# Altium footprint library 6-Connectors-4.PcbLib: 166 footprints (part 3 of 12)
Each footprint in its own frame and in the unit in brackets; x right, y up, seen from the top. Pads: shape width x height; smd on the part's side, far side on the other; paste and mask are expansions set on the pad; w line width, h text height; cw(c..) or ccw(c..) is an arc to the next point about the centre after c.
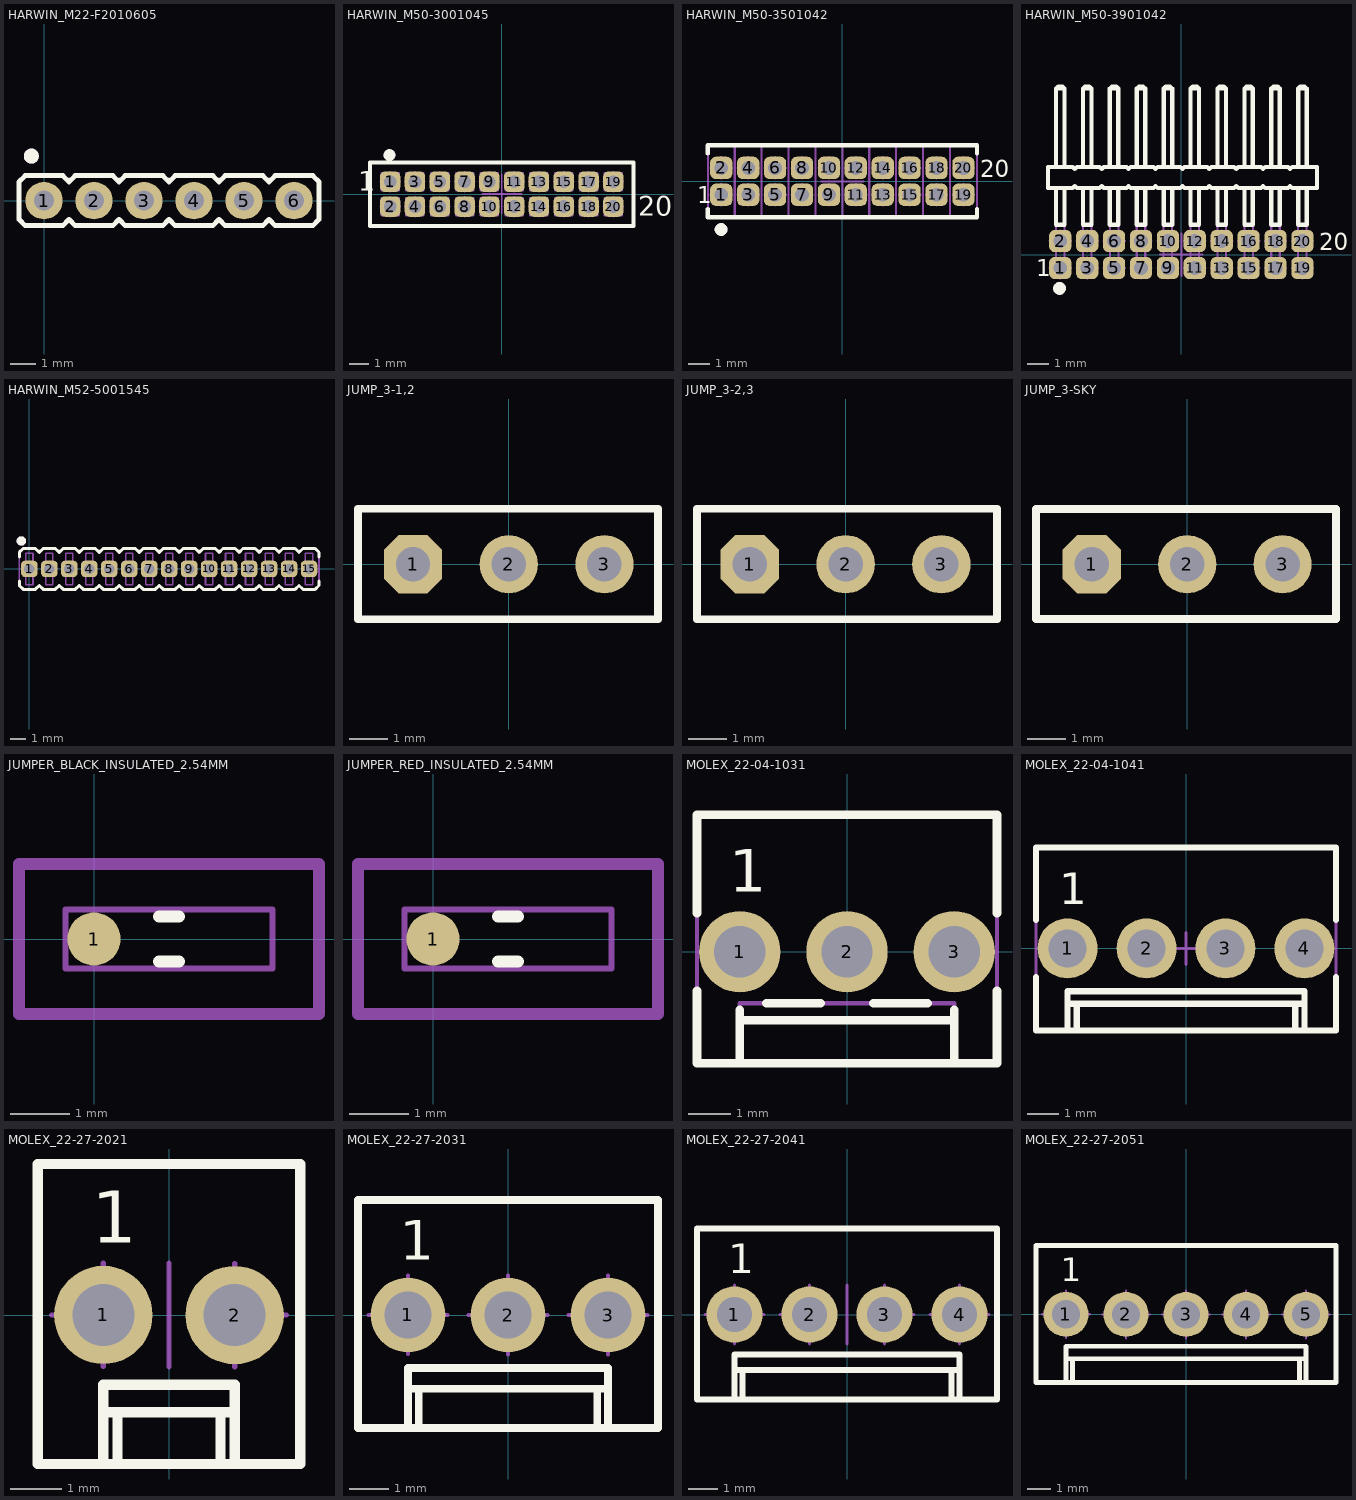
[diagram p2: the footprints below, top view; thin cyan lines are the x and y axes]

## HARWIN_M22-F2010605 [mm] "6 Contacts, Pitch 2mm - SIL Vertical Pin Header"
height 5
pads (6):
  round 1.5 hole 0.8: 1(0,0) 2(2,0) 3(4,0) 4(6,0) 5(8,0) 6(10,0)
Top Overlay:
  circle w0.3: c-0.508,1.778 r0.15
  lines w0.2: -1,-0.75 -0.75,-1 0.75,-1 1,-0.75 1.25,-1 2.75,-1 3,-0.75 3.25,-1 4.75,-1 5,-0.75 5.25,-1 6.75,-1 7,-0.75 7.25,-1 8.75,-1 9,-0.75 9.25,-1 10.75,-1 11,-0.75 11,0.75 10.75,1 9.25,1 9,0.75 8.75,1 7.25,1 7,0.75 6.75,1 5.25,1 5,0.75 4.75,1 3.25,1 3,0.75 2.75,1 1.25,1 1,0.75 0.75,1 -0.75,1 -1,0.75 -1,-0.75
Mechanical 8:
  lines w0.1: -0.5,0 0,0 ; 0,-0.5 0,0 ; 0,0.5 0,0 ; 0.5,0 0,0 ; 1.5,0 2,0 ; 2,-0.5 2,0 ; 2,0.5 2,0 ; 2.5,0 2,0 ; 3.5,0 4,0 ; 4,-0.5 4,0 ; 4,0.5 4,0 ; 4.5,0 4,0 ; 5.5,0 6,0 ; 6,-0.5 6,0 ; 6,0.5 6,0 ; 6.5,0 6,0 ; 7.5,0 8,0 ; 8,-0.5 8,0 ; 8,0.5 8,0 ; 8.5,0 8,0 ; 9.5,0 10,0 ; 10,-0.5 10,0 ; 10,0.5 10,0 ; 10.5,0 10,0
Mechanical 14:
  circle w0.3: c-0.508,1.778 r0.15
  lines w0.1: -1,-0.75 -0.75,-1 0.75,-1 1,-0.75 1.25,-1 2.75,-1 3,-0.75 3.25,-1 4.75,-1 5,-0.75 5.25,-1 6.75,-1 7,-0.75 7.25,-1 8.75,-1 9,-0.75 9.25,-1 10.75,-1 11,-0.75 11,0.75 10.75,1 9.25,1 9,0.75 8.75,1 7.25,1 7,0.75 6.75,1 5.25,1 5,0.75 4.75,1 3.25,1 3,0.75 2.75,1 1.25,1 1,0.75 0.75,1 -0.75,1 -1,0.75 -1,-0.75
3D body "HARWIN_M22-F2010605.stp": height 5, standoff -3.4, extent -1,-1 11,1

## HARWIN_M50-3001045 [mm] "20 Contacts, Pitch 1.27mm - Top Entry, Dual Row Through Mount Socket"
height 4.55
pads (20):
  rrect50% 1.05x1.05 hole 0.65: 1(-5.715,0.635) 2(-5.715,-0.635) 3(-4.445,0.635) 4(-4.445,-0.635) 5(-3.175,0.635) 6(-3.175,-0.635) 7(-1.905,0.635) 8(-1.905,-0.635) 9(-0.635,0.635) 10(-0.635,-0.635) 11(0.635,0.635) 12(0.635,-0.635) 13(1.905,0.635) 14(1.905,-0.635) 15(3.175,0.635) 16(3.175,-0.635) 17(4.445,0.635) 18(4.445,-0.635) 19(5.715,0.635) 20(5.715,-0.635)
Top Overlay:
  circle w0.3: c-5.75,2 r0.15
  lines w0.2: -6.75,-1.625 6.75,-1.625 6.75,1.625 -6.75,1.625 -6.75,-1.625
  text "1" at -7.362,0.162 h1
  text "20" at 7,-1.1 h1
Mechanical 8:
  lines w0.1: -6.215,-0.635 -5.715,-0.635 ; -6.215,0.635 -5.715,0.635 ; -5.715,-1.135 -5.715,-0.635 ; -5.715,-0.135 -5.715,-0.635 ; -5.715,0.135 -5.715,0.635 ; -5.715,1.135 -5.715,0.635 ; -5.215,-0.635 -5.715,-0.635 ; -5.215,0.635 -5.715,0.635 ; -4.945,-0.635 -4.445,-0.635 ; -4.945,0.635 -4.445,0.635 ; -4.445,-1.135 -4.445,-0.635 ; -4.445,-0.135 -4.445,-0.635 ; -4.445,0.135 -4.445,0.635 ; -4.445,1.135 -4.445,0.635 ; -3.945,-0.635 -4.445,-0.635 ; -3.945,0.635 -4.445,0.635 ; -3.675,-0.635 -3.175,-0.635 ; -3.675,0.635 -3.175,0.635 ; -3.175,-1.135 -3.175,-0.635 ; -3.175,-0.135 -3.175,-0.635 ; -3.175,0.135 -3.175,0.635 ; -3.175,1.135 -3.175,0.635 ; -2.675,-0.635 -3.175,-0.635 ; -2.675,0.635 -3.175,0.635 ; -2.405,-0.635 -1.905,-0.635 ; -2.405,0.635 -1.905,0.635 ; -1.905,-1.135 -1.905,-0.635 ; -1.905,-0.135 -1.905,-0.635 ; -1.905,0.135 -1.905,0.635 ; -1.905,1.135 -1.905,0.635 ; -1.405,-0.635 -1.905,-0.635 ; -1.405,0.635 -1.905,0.635 ; -1.135,-0.635 -0.635,-0.635 ; -1.135,0.635 -0.635,0.635 ; -1,0 0,0 ; -0.635,-1.135 -0.635,-0.635 ; -0.635,-0.135 -0.635,-0.635 ; -0.635,0.135 -0.635,0.635 ; -0.635,1.135 -0.635,0.635 ; -0.135,-0.635 -0.635,-0.635 ; -0.135,0.635 -0.635,0.635 ; 0,-1 0,0 ; 0,1 0,0 ; 0.135,-0.635 0.635,-0.635 ; 0.135,0.635 0.635,0.635 ; 0.635,-1.135 0.635,-0.635 ; 0.635,-0.135 0.635,-0.635 ; 0.635,0.135 0.635,0.635 ; 0.635,1.135 0.635,0.635 ; 1,0 0,0 ; 1.135,-0.635 0.635,-0.635 ; 1.135,0.635 0.635,0.635 ; 1.405,-0.635 1.905,-0.635 ; 1.405,0.635 1.905,0.635 ; 1.905,-1.135 1.905,-0.635 ; 1.905,-0.135 1.905,-0.635 ; 1.905,0.135 1.905,0.635 ; 1.905,1.135 1.905,0.635 ; 2.405,-0.635 1.905,-0.635 ; 2.405,0.635 1.905,0.635 ; 2.675,-0.635 3.175,-0.635 ; 2.675,0.635 3.175,0.635 ; 3.175,-1.135 3.175,-0.635 ; 3.175,-0.135 3.175,-0.635 ; 3.175,0.135 3.175,0.635 ; 3.175,1.135 3.175,0.635 ; 3.675,-0.635 3.175,-0.635 ; 3.675,0.635 3.175,0.635 ; 3.945,-0.635 4.445,-0.635 ; 3.945,0.635 4.445,0.635 ; 4.445,-1.135 4.445,-0.635 ; 4.445,-0.135 4.445,-0.635 ; 4.445,0.135 4.445,0.635 ; 4.445,1.135 4.445,0.635 ; 4.945,-0.635 4.445,-0.635 ; 4.945,0.635 4.445,0.635 ; 5.215,-0.635 5.715,-0.635 ; 5.215,0.635 5.715,0.635 ; 5.715,-1.135 5.715,-0.635 ; 5.715,-0.135 5.715,-0.635 ; 5.715,0.135 5.715,0.635 ; 5.715,1.135 5.715,0.635 ; 6.215,-0.635 5.715,-0.635 ; 6.215,0.635 5.715,0.635
Mechanical 14:
  drawing of 245 lines, arcs and shapes, not listed
  text "1" at -7.362,0.162 h1
  text "20" at 7,-1.1 h1
3D body "HARWIN_M50-3001045.stp": height 4.55, standoff -2.4, extent -6.75,-1.625 6.75,1.625

## HARWIN_M50-3501042 [mm] "20 Contacts, Pitch 1.27mm - Horizontal, Dual Row Through Mount Right Angle Straight Header"
height 4.15
pads (20):
  rrect50% 1.05x1.05 hole 0.65: 1(-5.715,-0.635) 2(-5.715,0.635) 3(-4.445,-0.635) 4(-4.445,0.635) 5(-3.175,-0.635) 6(-3.175,0.635) 7(-1.905,-0.635) 8(-1.905,0.635) 9(-0.635,-0.635) 10(-0.635,0.635) 11(0.635,-0.635) 12(0.635,0.635) 13(1.905,-0.635) 14(1.905,0.635) 15(3.175,-0.635) 16(3.175,0.635) 17(4.445,-0.635) 18(4.445,0.635) 19(5.715,-0.635) 20(5.715,0.635)
Top Overlay:
  circle w0.3: c-5.725,-2.275 r0.15
  lines w0.2: -6.35,-1.308 -6.35,-1.7 6.35,-1.7 6.35,-1.308 ; -6.35,1.308 -6.35,1.7 6.35,1.7 6.35,1.308
  text "1" at -6.862,-1.038 h0.8
  text "20" at 6.5,0.2 h0.8
Mechanical 8:
  lines w0.1: -6.215,-0.635 -5.715,-0.635 ; -6.215,0.635 -5.715,0.635 ; -5.715,-1.135 -5.715,-0.635 ; -5.715,-0.135 -5.715,-0.635 ; -5.715,0.135 -5.715,0.635 ; -5.715,1.135 -5.715,0.635 ; -5.215,-0.635 -5.715,-0.635 ; -5.215,0.635 -5.715,0.635 ; -4.945,-0.635 -4.445,-0.635 ; -4.945,0.635 -4.445,0.635 ; -4.445,-1.135 -4.445,-0.635 ; -4.445,-0.135 -4.445,-0.635 ; -4.445,0.135 -4.445,0.635 ; -4.445,1.135 -4.445,0.635 ; -3.945,-0.635 -4.445,-0.635 ; -3.945,0.635 -4.445,0.635 ; -3.675,-0.635 -3.175,-0.635 ; -3.675,0.635 -3.175,0.635 ; -3.175,-1.135 -3.175,-0.635 ; -3.175,-0.135 -3.175,-0.635 ; -3.175,0.135 -3.175,0.635 ; -3.175,1.135 -3.175,0.635 ; -2.675,-0.635 -3.175,-0.635 ; -2.675,0.635 -3.175,0.635 ; -2.405,-0.635 -1.905,-0.635 ; -2.405,0.635 -1.905,0.635 ; -1.905,-1.135 -1.905,-0.635 ; -1.905,-0.135 -1.905,-0.635 ; -1.905,0.135 -1.905,0.635 ; -1.905,1.135 -1.905,0.635 ; -1.405,-0.635 -1.905,-0.635 ; -1.405,0.635 -1.905,0.635 ; -1.135,-0.635 -0.635,-0.635 ; -1.135,0.635 -0.635,0.635 ; -1,0 0,0 ; -0.635,-1.135 -0.635,-0.635 ; -0.635,-0.135 -0.635,-0.635 ; -0.635,0.135 -0.635,0.635 ; -0.635,1.135 -0.635,0.635 ; -0.135,-0.635 -0.635,-0.635 ; -0.135,0.635 -0.635,0.635 ; 0,-1 0,0 ; 0,1 0,0 ; 0.135,-0.635 0.635,-0.635 ; 0.135,0.635 0.635,0.635 ; 0.635,-1.135 0.635,-0.635 ; 0.635,-0.135 0.635,-0.635 ; 0.635,0.135 0.635,0.635 ; 0.635,1.135 0.635,0.635 ; 1,0 0,0 ; 1.135,-0.635 0.635,-0.635 ; 1.135,0.635 0.635,0.635 ; 1.405,-0.635 1.905,-0.635 ; 1.405,0.635 1.905,0.635 ; 1.905,-1.135 1.905,-0.635 ; 1.905,-0.135 1.905,-0.635 ; 1.905,0.135 1.905,0.635 ; 1.905,1.135 1.905,0.635 ; 2.405,-0.635 1.905,-0.635 ; 2.405,0.635 1.905,0.635 ; 2.675,-0.635 3.175,-0.635 ; 2.675,0.635 3.175,0.635 ; 3.175,-1.135 3.175,-0.635 ; 3.175,-0.135 3.175,-0.635 ; 3.175,0.135 3.175,0.635 ; 3.175,1.135 3.175,0.635 ; 3.675,-0.635 3.175,-0.635 ; 3.675,0.635 3.175,0.635 ; 3.945,-0.635 4.445,-0.635 ; 3.945,0.635 4.445,0.635 ; 4.445,-1.135 4.445,-0.635 ; 4.445,-0.135 4.445,-0.635 ; 4.445,0.135 4.445,0.635 ; 4.445,1.135 4.445,0.635 ; 4.945,-0.635 4.445,-0.635 ; 4.945,0.635 4.445,0.635 ; 5.215,-0.635 5.715,-0.635 ; 5.215,0.635 5.715,0.635 ; 5.715,-1.135 5.715,-0.635 ; 5.715,-0.135 5.715,-0.635 ; 5.715,0.135 5.715,0.635 ; 5.715,1.135 5.715,0.635 ; 6.215,-0.635 5.715,-0.635 ; 6.215,0.635 5.715,0.635
Mechanical 14:
  drawing of 254 lines, arcs and shapes, not listed
  text "1" at -6.862,-1.038 h0.8
  text "20" at 6.5,0.2 h0.8
3D body "HARWIN_M50-3501042.stp": height 4, standoff -2.3, extent -6.35,-1.7 6.35,1.7

## HARWIN_M50-3901042 [mm] "20 Contacts, Pitch 1.27mm - Horizontal, Dual Row Through Mount Right Angle Header"
height 3.41
pads (20):
  rrect50% 1.05x1.05 hole 0.65: 1(-5.715,-0.635) 2(-5.715,0.635) 3(-4.445,-0.635) 4(-4.445,0.635) 5(-3.175,-0.635) 6(-3.175,0.635) 7(-1.905,-0.635) 8(-1.905,0.635) 9(-0.635,-0.635) 10(-0.635,0.635) 11(0.635,-0.635) 12(0.635,0.635) 13(1.905,-0.635) 14(1.905,0.635) 15(3.175,-0.635) 16(3.175,0.635) 17(4.445,-0.635) 18(4.445,0.635) 19(5.715,-0.635) 20(5.715,0.635)
Top Overlay:
  circle w0.3: c-5.75,-1.6 r0.15
  lines w0.2: -5.915,3.135 -5.915,1.41 -5.515,1.41 -5.515,3.135 ; -5.915,4.135 -5.915,7.835 ; -5.515,4.135 -5.515,7.835 ; -4.645,3.135 -4.645,1.41 -4.245,1.41 -4.245,3.135 ; -4.645,4.135 -4.645,7.835 ; -4.245,4.135 -4.245,7.835 ; -3.375,3.135 -3.375,1.41 -2.975,1.41 -2.975,3.135 ; -3.375,4.135 -3.375,7.835 ; -2.975,4.135 -2.975,7.835 ; -2.105,3.135 -2.105,1.41 -1.705,1.41 -1.705,3.135 ; -2.105,4.135 -2.105,7.835 ; -1.705,4.135 -1.705,7.835 ; -0.835,3.135 -0.835,1.41 -0.435,1.41 -0.435,3.135 ; -0.835,4.135 -0.835,7.835 ; -0.435,4.135 -0.435,7.835 ; 0.435,3.135 0.435,1.41 0.835,1.41 0.835,3.135 ; 0.435,4.135 0.435,7.835 ; 0.835,4.135 0.835,7.835 ; 1.705,3.135 1.705,1.41 2.105,1.41 2.105,3.135 ; 1.705,4.135 1.705,7.835 ; 2.105,4.135 2.105,7.835 ; 2.975,3.135 2.975,1.41 3.375,1.41 3.375,3.135 ; 2.975,4.135 2.975,7.835 ; 3.375,4.135 3.375,7.835 ; 4.245,3.135 4.245,1.41 4.645,1.41 4.645,3.135 ; 4.245,4.135 4.245,7.835 ; 4.645,4.135 4.645,7.835 ; 5.515,3.135 5.515,1.41 5.915,1.41 5.915,3.135 ; 5.515,4.135 5.515,7.835 ; 5.915,4.135 5.915,7.835 ; -6.3,3.135 -5.13,3.135 -5.03,3.235 -4.93,3.135 -3.86,3.135 -3.76,3.235 -3.66,3.135 -2.59,3.135 -2.49,3.235 -2.39,3.135 -1.32,3.135 -1.22,3.235 -1.12,3.135 -0.05,3.135 0.05,3.235 0.15,3.135 1.22,3.135 1.32,3.235 1.42,3.135 2.49,3.135 2.59,3.235 2.69,3.135 3.76,3.135 3.86,3.235 3.96,3.135 5.03,3.135 5.13,3.235 5.23,3.135 6.4,3.135 6.4,4.135 5.23,4.135 5.13,4.035 5.03,4.135 3.96,4.135 3.86,4.035 3.76,4.135 2.69,4.135 2.59,4.035 2.49,4.135 1.42,4.135 1.32,4.035 1.22,4.135 0.15,4.135 0.05,4.035 -0.05,4.135 -1.12,4.135 -1.22,4.035 -1.32,4.135 -2.39,4.135 -2.49,4.035 -2.59,4.135 -3.66,4.135 -3.76,4.035 -3.86,4.135 -4.93,4.135 -5.03,4.035 -5.13,4.135 -6.3,4.135 ; -6.3,3.135 -6.3,4.135 ; -6.3,3.135 -6.3,4.135 ; -5.915,7.835 -5.515,7.835 ; -5.915,7.835 -5.815,7.935 -5.615,7.935 -5.515,7.835 ; -4.645,7.835 -4.245,7.835 ; -4.645,7.835 -4.545,7.935 -4.345,7.935 -4.245,7.835 ; -3.375,7.835 -2.975,7.835 ; -3.375,7.835 -3.275,7.935 -3.075,7.935 -2.975,7.835 ; -2.105,7.835 -1.705,7.835 ; -2.105,7.835 -2.005,7.935 -1.805,7.935 -1.705,7.835 ; -0.835,7.835 -0.435,7.835 ; -0.835,7.835 -0.735,7.935 -0.535,7.935 -0.435,7.835 ; 0.435,7.835 0.835,7.835 ; 0.435,7.835 0.535,7.935 0.735,7.935 0.835,7.835 ; 1.705,7.835 2.105,7.835 ; 1.705,7.835 1.805,7.935 2.005,7.935 2.105,7.835 ; 2.975,7.835 3.375,7.835 ; 2.975,7.835 3.075,7.935 3.275,7.935 3.375,7.835 ; 4.245,7.835 4.645,7.835 ; 4.245,7.835 4.345,7.935 4.545,7.935 4.645,7.835 ; 5.515,7.835 5.915,7.835 ; 5.515,7.835 5.615,7.935 5.815,7.935 5.915,7.835
  text "20" at 6.5,0.2 h0.8
  text "1" at -6.862,-1.038 h0.8
Mechanical 8:
  lines w0.1: -6.215,-0.635 -5.715,-0.635 ; -6.215,0.635 -5.715,0.635 ; -5.715,-1.135 -5.715,-0.635 ; -5.715,-0.135 -5.715,-0.635 ; -5.715,0.135 -5.715,0.635 ; -5.715,1.135 -5.715,0.635 ; -5.215,-0.635 -5.715,-0.635 ; -5.215,0.635 -5.715,0.635 ; -4.945,-0.635 -4.445,-0.635 ; -4.945,0.635 -4.445,0.635 ; -4.445,-1.135 -4.445,-0.635 ; -4.445,-0.135 -4.445,-0.635 ; -4.445,0.135 -4.445,0.635 ; -4.445,1.135 -4.445,0.635 ; -3.945,-0.635 -4.445,-0.635 ; -3.945,0.635 -4.445,0.635 ; -3.675,-0.635 -3.175,-0.635 ; -3.675,0.635 -3.175,0.635 ; -3.175,-1.135 -3.175,-0.635 ; -3.175,-0.135 -3.175,-0.635 ; -3.175,0.135 -3.175,0.635 ; -3.175,1.135 -3.175,0.635 ; -2.675,-0.635 -3.175,-0.635 ; -2.675,0.635 -3.175,0.635 ; -2.405,-0.635 -1.905,-0.635 ; -2.405,0.635 -1.905,0.635 ; -1.905,-1.135 -1.905,-0.635 ; -1.905,-0.135 -1.905,-0.635 ; -1.905,0.135 -1.905,0.635 ; -1.905,1.135 -1.905,0.635 ; -1.405,-0.635 -1.905,-0.635 ; -1.405,0.635 -1.905,0.635 ; -1.135,-0.635 -0.635,-0.635 ; -1.135,0.635 -0.635,0.635 ; -1,0 0,0 ; -0.635,-1.135 -0.635,-0.635 ; -0.635,-0.135 -0.635,-0.635 ; -0.635,0.135 -0.635,0.635 ; -0.635,1.135 -0.635,0.635 ; -0.135,-0.635 -0.635,-0.635 ; -0.135,0.635 -0.635,0.635 ; 0,-1 0,0 ; 0,1 0,0 ; 0.135,-0.635 0.635,-0.635 ; 0.135,0.635 0.635,0.635 ; 0.635,-1.135 0.635,-0.635 ; 0.635,-0.135 0.635,-0.635 ; 0.635,0.135 0.635,0.635 ; 0.635,1.135 0.635,0.635 ; 1,0 0,0 ; 1.135,-0.635 0.635,-0.635 ; 1.135,0.635 0.635,0.635 ; 1.405,-0.635 1.905,-0.635 ; 1.405,0.635 1.905,0.635 ; 1.905,-1.135 1.905,-0.635 ; 1.905,-0.135 1.905,-0.635 ; 1.905,0.135 1.905,0.635 ; 1.905,1.135 1.905,0.635 ; 2.405,-0.635 1.905,-0.635 ; 2.405,0.635 1.905,0.635 ; 2.675,-0.635 3.175,-0.635 ; 2.675,0.635 3.175,0.635 ; 3.175,-1.135 3.175,-0.635 ; 3.175,-0.135 3.175,-0.635 ; 3.175,0.135 3.175,0.635 ; 3.175,1.135 3.175,0.635 ; 3.675,-0.635 3.175,-0.635 ; 3.675,0.635 3.175,0.635 ; 3.945,-0.635 4.445,-0.635 ; 3.945,0.635 4.445,0.635 ; 4.445,-1.135 4.445,-0.635 ; 4.445,-0.135 4.445,-0.635 ; 4.445,0.135 4.445,0.635 ; 4.445,1.135 4.445,0.635 ; 4.945,-0.635 4.445,-0.635 ; 4.945,0.635 4.445,0.635 ; 5.215,-0.635 5.715,-0.635 ; 5.215,0.635 5.715,0.635 ; 5.715,-1.135 5.715,-0.635 ; 5.715,-0.135 5.715,-0.635 ; 5.715,0.135 5.715,0.635 ; 5.715,1.135 5.715,0.635 ; 6.215,-0.635 5.715,-0.635 ; 6.215,0.635 5.715,0.635
Mechanical 14:
  circle w0.3: c-5.75,-1.6 r0.15
  lines w0.1: -5.915,3.135 -5.915,-0.835 -5.515,-0.835 -5.515,3.135 ; -5.915,4.135 -5.915,7.835 ; -5.515,4.135 -5.515,7.835 ; -4.645,3.135 -4.645,-0.835 -4.245,-0.835 -4.245,3.135 ; -4.645,4.135 -4.645,7.835 ; -4.245,4.135 -4.245,7.835 ; -3.375,3.135 -3.375,-0.835 -2.975,-0.835 -2.975,3.135 ; -3.375,4.135 -3.375,7.835 ; -2.975,4.135 -2.975,7.835 ; -2.105,3.135 -2.105,-0.835 -1.705,-0.835 -1.705,3.135 ; -2.105,4.135 -2.105,7.835 ; -1.705,4.135 -1.705,7.835 ; -0.835,3.135 -0.835,-0.835 -0.435,-0.835 -0.435,3.135 ; -0.835,4.135 -0.835,7.835 ; -0.435,4.135 -0.435,7.835 ; 0.435,3.135 0.435,-0.835 0.835,-0.835 0.835,3.135 ; 0.435,4.135 0.435,7.835 ; 0.835,4.135 0.835,7.835 ; 1.705,3.135 1.705,-0.835 2.105,-0.835 2.105,3.135 ; 1.705,4.135 1.705,7.835 ; 2.105,4.135 2.105,7.835 ; 2.975,3.135 2.975,-0.835 3.375,-0.835 3.375,3.135 ; 2.975,4.135 2.975,7.835 ; 3.375,4.135 3.375,7.835 ; 4.245,3.135 4.245,-0.835 4.645,-0.835 4.645,3.135 ; 4.245,4.135 4.245,7.835 ; 4.645,4.135 4.645,7.835 ; 5.515,3.135 5.515,-0.835 5.915,-0.835 5.915,3.135 ; 5.515,4.135 5.515,7.835 ; 5.915,4.135 5.915,7.835 ; -6.3,3.135 -6.3,4.135 ; -6.3,3.135 -5.13,3.135 -5.03,3.235 -4.93,3.135 -3.86,3.135 -3.76,3.235 -3.66,3.135 -2.59,3.135 -2.49,3.235 -2.39,3.135 -1.32,3.135 -1.22,3.235 -1.12,3.135 -0.05,3.135 0.05,3.235 0.15,3.135 1.22,3.135 1.32,3.235 1.42,3.135 2.49,3.135 2.59,3.235 2.69,3.135 3.76,3.135 3.86,3.235 3.96,3.135 5.03,3.135 5.13,3.235 5.23,3.135 6.4,3.135 6.4,4.135 5.23,4.135 5.13,4.035 5.03,4.135 3.96,4.135 3.86,4.035 3.76,4.135 2.69,4.135 2.59,4.035 2.49,4.135 1.42,4.135 1.32,4.035 1.22,4.135 0.15,4.135 0.05,4.035 -0.05,4.135 -1.12,4.135 -1.22,4.035 -1.32,4.135 -2.39,4.135 -2.49,4.035 -2.59,4.135 -3.66,4.135 -3.76,4.035 -3.86,4.135 -4.93,4.135 -5.03,4.035 -5.13,4.135 -6.3,4.135 ; -6.3,3.135 -6.3,4.135 ; -5.915,7.835 -5.515,7.835 ; -5.915,7.835 -5.815,7.935 -5.615,7.935 -5.515,7.835 ; -4.645,7.835 -4.245,7.835 ; -4.645,7.835 -4.545,7.935 -4.345,7.935 -4.245,7.835 ; -3.375,7.835 -2.975,7.835 ; -3.375,7.835 -3.275,7.935 -3.075,7.935 -2.975,7.835 ; -2.105,7.835 -1.705,7.835 ; -2.105,7.835 -2.005,7.935 -1.805,7.935 -1.705,7.835 ; -0.835,7.835 -0.435,7.835 ; -0.835,7.835 -0.735,7.935 -0.535,7.935 -0.435,7.835 ; 0.435,7.835 0.835,7.835 ; 0.435,7.835 0.535,7.935 0.735,7.935 0.835,7.835 ; 1.705,7.835 2.105,7.835 ; 1.705,7.835 1.805,7.935 2.005,7.935 2.105,7.835 ; 2.975,7.835 3.375,7.835 ; 2.975,7.835 3.075,7.935 3.275,7.935 3.375,7.835 ; 4.245,7.835 4.645,7.835 ; 4.245,7.835 4.345,7.935 4.545,7.935 4.645,7.835 ; 5.515,7.835 5.915,7.835 ; 5.515,7.835 5.615,7.935 5.815,7.935 5.915,7.835
  text "20" at 6.5,0.2 h0.8
  text "1" at -6.862,-1.038 h0.8
3D body "HARWIN_M50-3901042.stp": height 3.41, standoff -2, extent -6.3,-0.835 6.4,7.935
3D body "v105-065.stp": height 0.02, standoff -1.65, extent -6.24,0.11 -5.19,1.16
3D body "v105-065.stp": height 0.02, standoff -1.65, extent -6.24,-1.16 -5.19,-0.11
3D body "v105-065.stp": height 0.02, standoff -1.65, extent -4.97,0.11 -3.92,1.16
3D body "v105-065.stp": height 0.02, standoff -1.65, extent -4.97,-1.16 -3.92,-0.11
3D body "v105-065.stp": height 0.02, standoff -1.65, extent -3.7,0.11 -2.65,1.16
3D body "v105-065.stp": height 0.02, standoff -1.65, extent -3.7,-1.16 -2.65,-0.11
3D body "v105-065.stp": height 0.02, standoff -1.65, extent -2.43,0.11 -1.38,1.16
3D body "v105-065.stp": height 0.02, standoff -1.65, extent -2.43,-1.16 -1.38,-0.11
3D body "v105-065.stp": height 0.02, standoff -1.65, extent -1.16,0.11 -0.11,1.16
3D body "v105-065.stp": height 0.02, standoff -1.65, extent -1.16,-1.16 -0.11,-0.11
3D body "v105-065.stp": height 0.02, standoff -1.65, extent 0.11,0.11 1.16,1.16
3D body "v105-065.stp": height 0.02, standoff -1.65, extent 0.11,-1.16 1.16,-0.11
3D body "v105-065.stp": height 0.02, standoff -1.65, extent 1.38,0.11 2.43,1.16
3D body "v105-065.stp": height 0.02, standoff -1.65, extent 1.38,-1.16 2.43,-0.11
3D body "v105-065.stp": height 0.02, standoff -1.65, extent 2.65,0.11 3.7,1.16
3D body "v105-065.stp": height 0.02, standoff -1.65, extent 2.65,-1.16 3.7,-0.11
3D body "v105-065.stp": height 0.02, standoff -1.65, extent 3.92,0.11 4.97,1.16
3D body "v105-065.stp": height 0.02, standoff -1.65, extent 3.92,-1.16 4.97,-0.11
3D body "v105-065.stp": height 0.02, standoff -1.65, extent 5.19,0.11 6.24,1.16
3D body "v105-065.stp": height 0.02, standoff -1.65, extent 5.19,-1.16 6.24,-0.11

## HARWIN_M52-5001545 [mm] "1.27mm Pitch SIL Vertical PC Tail Socket"
height 4.8
pads (15):
  rrect50% 1.05x1.05 hole 0.65: 1(0,0) 2(1.27,0) 3(2.54,0) 4(3.81,0) 5(5.08,0) 6(6.35,0) 7(7.62,0) 8(8.89,0) 9(10.16,0) 10(11.43,0) 11(12.7,0) 12(13.97,0) 13(15.24,0) 14(16.51,0) 15(17.78,0)
Top Overlay:
  circle w0.3: c-0.508,1.778 r0.15
  lines w0.2: -0.635,-0.773 -0.635,-1.05 -0.385,-1.3 0.385,-1.3 0.635,-1.05 0.885,-1.3 1.655,-1.3 1.905,-1.05 2.155,-1.3 2.925,-1.3 3.175,-1.05 3.425,-1.3 4.195,-1.3 4.445,-1.05 4.695,-1.3 5.465,-1.3 5.715,-1.05 5.965,-1.3 6.735,-1.3 6.985,-1.05 7.235,-1.3 8.005,-1.3 8.255,-1.05 8.505,-1.3 9.275,-1.3 9.525,-1.05 9.775,-1.3 10.545,-1.3 10.795,-1.05 11.045,-1.3 11.815,-1.3 12.065,-1.05 12.315,-1.3 13.085,-1.3 13.335,-1.05 13.585,-1.3 14.355,-1.3 14.605,-1.05 14.855,-1.3 15.625,-1.3 15.875,-1.05 16.125,-1.3 16.895,-1.3 17.145,-1.05 17.395,-1.3 18.165,-1.3 18.415,-1.05 18.415,-0.773 ; -0.635,0.773 -0.635,1.05 -0.385,1.3 0.385,1.3 0.635,1.05 0.885,1.3 1.655,1.3 1.905,1.05 2.155,1.3 2.925,1.3 3.175,1.05 3.425,1.3 4.195,1.3 4.445,1.05 4.695,1.3 5.465,1.3 5.715,1.05 5.965,1.3 6.735,1.3 6.985,1.05 7.235,1.3 8.005,1.3 8.255,1.05 8.505,1.3 9.275,1.3 9.525,1.05 9.775,1.3 10.545,1.3 10.795,1.05 11.045,1.3 11.815,1.3 12.065,1.05 12.315,1.3 13.085,1.3 13.335,1.05 13.585,1.3 14.355,1.3 14.605,1.05 14.855,1.3 15.625,1.3 15.875,1.05 16.125,1.3 16.895,1.3 17.145,1.05 17.395,1.3 18.165,1.3 18.415,1.05 18.415,0.773
Mechanical 8:
  lines w0.1: -0.5,0 0,0 ; 0,-0.5 0,0 ; 0,0.5 0,0 ; 0.5,0 0,0 ; 0.77,0 1.27,0 ; 1.27,-0.5 1.27,0 ; 1.27,0.5 1.27,0 ; 1.77,0 1.27,0 ; 2.04,0 2.54,0 ; 2.54,-0.5 2.54,0 ; 2.54,0.5 2.54,0 ; 3.04,0 2.54,0 ; 3.31,0 3.81,0 ; 3.81,-0.5 3.81,0 ; 3.81,0.5 3.81,0 ; 4.31,0 3.81,0 ; 4.58,0 5.08,0 ; 5.08,-0.5 5.08,0 ; 5.08,0.5 5.08,0 ; 5.58,0 5.08,0 ; 5.85,0 6.35,0 ; 6.35,-0.5 6.35,0 ; 6.35,0.5 6.35,0 ; 6.85,0 6.35,0 ; 7.12,0 7.62,0 ; 7.62,-0.5 7.62,0 ; 7.62,0.5 7.62,0 ; 8.12,0 7.62,0 ; 8.39,0 8.89,0 ; 8.89,-0.5 8.89,0 ; 8.89,0.5 8.89,0 ; 9.39,0 8.89,0 ; 9.66,0 10.16,0 ; 10.16,-0.5 10.16,0 ; 10.16,0.5 10.16,0 ; 10.66,0 10.16,0 ; 10.93,0 11.43,0 ; 11.43,-0.5 11.43,0 ; 11.43,0.5 11.43,0 ; 11.93,0 11.43,0 ; 12.2,0 12.7,0 ; 12.7,-0.5 12.7,0 ; 12.7,0.5 12.7,0 ; 13.2,0 12.7,0 ; 13.47,0 13.97,0 ; 13.97,-0.5 13.97,0 ; 13.97,0.5 13.97,0 ; 14.47,0 13.97,0 ; 14.74,0 15.24,0 ; 15.24,-0.5 15.24,0 ; 15.24,0.5 15.24,0 ; 15.74,0 15.24,0 ; 16.01,0 16.51,0 ; 16.51,-0.5 16.51,0 ; 16.51,0.5 16.51,0 ; 17.01,0 16.51,0 ; 17.28,0 17.78,0 ; 17.78,-0.5 17.78,0 ; 17.78,0.5 17.78,0 ; 18.28,0 17.78,0
Mechanical 14:
  drawing of 153 lines, arcs and shapes, not listed
3D body "HARWIN_M52-5001545.stp": height 4.6, standoff -3, extent -0.635,-1.3 18.415,1.3

## JUMP_3-1,2 [mil]
height 295.28
pads (3):
  oct 60x60 hole 35.43 mask+2.76: 1(-98.43,0)
  round 60 hole 35.43: 2(0,0)
  round 60 hole 35.43 mask+2.76: 3(98.43,0)
Top Overlay:
  lines w7.87: -155,-56.5 153.5,-56.5 153.5,57 -155,57 -155,-56.5
3D body "m20-254via.stp": height 3.94, standoff -71.65, extent 64.96,-33.46 131.9,33.47
3D body "m20-254via.stp": height 3.94, standoff -71.65, extent -33.46,-33.46 33.47,33.47
3D body "m20-254via.stp": height 3.94, standoff -71.65, extent -131.89,-33.46 -64.95,33.47
3D body "3pin-off.stp": height 326.77, standoff -124.02, extent -143.69,-49.2 145.29,49.23
3D body "254-jp.stp": height 334.65, standoff 98.43, extent -148.03,-48.22 48.04,48.23

## JUMP_3-2,3 [mil]
height 295.28
pads (3):
  oct 60x60 hole 35.43 mask+2.76: 1(-98.43,0)
  round 60 hole 35.43 mask+2.76: 2(0,0)
  round 60 hole 35.43: 3(98.43,0)
Top Overlay:
  lines w7.87: -152.5,-56.5 155.5,-56.5 155.5,57 -152.5,57 -152.5,-56.5
3D body "254-jp.stp": height 334.65, standoff 98.43, extent -48.03,-48.22 148.04,48.23
3D body "m20-254via.stp": height 3.94, standoff -71.65, extent -131.46,-33.46 -64.53,33.47
3D body "m20-254via.stp": height 3.94, standoff -71.65, extent -33.46,-33.46 33.47,33.47
3D body "m20-254via.stp": height 3.94, standoff -71.65, extent 64.96,-33.46 131.9,33.47
3D body "3pin-off.stp": height 326.77, standoff -124.02, extent -143.69,-49.2 145.29,49.23

## JUMP_3-SKY [mil]
height 295.28
pads (3):
  oct 60x60 hole 35.43 mask+2.76: 1(-98.42,0.01)
  round 60 hole 35.43 mask+2.76: 2(0.01,0.01) 3(98.43,0.01)
Top Overlay:
  lines w7.87: -155.99,-56.49 153.51,-56.49 153.51,57.01 -155.99,57.01 -155.99,-56.49
3D body "3pin-off.stp": height 326.77, standoff -124.02, extent -143.69,-49.2 145.29,49.23
3D body "m20-254via.stp": height 3.94, standoff -71.65, extent -131.88,-33.45 -64.95,33.48
3D body "m20-254via.stp": height 3.94, standoff -71.65, extent -33.45,-33.45 33.48,33.48
3D body "m20-254via.stp": height 3.94, standoff -71.65, extent 64.97,-33.45 131.91,33.48

## JUMPER_BLACK_INSULATED_2.54MM [mm] "Black Insulated Jumper Pitch 2.54mm W=2.5mm L=5mm H=6.5mm"
height 6.5
pads (1):
  round 0.9 smd paste-0.46 mask-0.46: 1(0,0)
Top Overlay:
  lines w0.2: 1.1,-0.381 1.44,-0.381 ; 1.1,0.381 1.44,0.381
Mechanical 13:
  lines w0.2: -1.27,-1.27 -1.27,1.27 3.81,1.27 3.81,-1.27 -1.27,-1.27
Mechanical 14:
  lines w0.1: -0.48,-0.5 -0.48,0.5 3.02,0.5 3.02,-0.5 -0.48,-0.5
3D body "JUMPER_BLACK_INSULATED_2.54MM.stp": height 8.2, standoff 1.7, extent -1.269,-1.269 3.731,1.231

## JUMPER_RED_INSULATED_2.54MM [mm] "Red Insulated Jumper Pitch 2.54mm W=2.5mm L=5mm H=6.5mm"
height 6.5
pads (1):
  round 0.9 smd paste-0.46 mask-0.46: 1(0,0)
Top Overlay:
  lines w0.2: 1.1,-0.381 1.44,-0.381 ; 1.1,0.381 1.44,0.381
Mechanical 13:
  lines w0.2: -1.27,-1.27 3.81,-1.27 3.81,1.27 -1.27,1.27 -1.27,-1.27
Mechanical 14:
  lines w0.1: -0.48,-0.5 3.02,-0.5 3.02,0.5 -0.48,0.5 -0.48,-0.5
3D body "JUMPER_RED_INSULATED_2.54MM.stp": height 8.2, standoff 1.7, extent -1.269,-1.269 3.731,1.231

## MOLEX_22-04-1031 [mm] "2.5mm (.100\") Pitch KK?Header, Single Row, Vertical, 3 Circuits"
height 11.7
pads (3):
  round 1.9 hole 1.2: 1(-2.5,0) 2(0,0) 3(2.5,0)
Top Overlay:
  lines w0.2: -3.5,-0.907 -3.5,-2.6 3.5,-2.6 3.5,-0.907 ; -3.5,0.907 -3.5,3.2 3.5,3.2 3.5,0.907 ; -2.5,-2.6 -2.5,-1.35 ; -2.5,-1.6 2.5,-1.6 ; -1.882,-1.2 -0.618,-1.2 ; 0.618,-1.2 1.882,-1.2 ; 2.5,-2.6 2.5,-1.35
  text "1" at -2.75,1.4 h1
Mechanical 8:
  lines w0.1: -3,0 -2.5,0 ; -2.5,-0.5 -2.5,0 ; -2.5,0.5 -2.5,0 ; -2,0 -2.5,0 ; -0.5,0 0,0 ; 0,-0.5 0,0 ; 0,0.5 0,0 ; 0.5,0 0,0 ; 2,0 2.5,0 ; 2.5,-0.5 2.5,0 ; 2.5,0.5 2.5,0 ; 3,0 2.5,0
Mechanical 14:
  lines w0.1: -2.5,-2.6 -2.5,-1.2 2.5,-1.2 2.5,-2.6 ; -2.5,-1.6 2.5,-1.6 ; -3.5,-2.6 3.5,-2.6 3.5,3.2 -3.5,3.2 -3.5,-2.6
  text "1" at -2.75,1.4 h1
3D body "MOLEX_22-04-1031.stp": height 11.7, standoff -3.4, extent -3.5,-2.6 3.5,3.2

## MOLEX_22-04-1041 [mm] "2.5mm (.100\") Pitch KK?Header, Single Row, Vertical, 4 Circuits"
height 11.7
pads (4):
  round 1.9 hole 1.2: 1(-3.75,0) 2(-1.25,0) 3(1.25,0) 4(3.75,0)
Top Overlay:
  lines w0.2: -4.75,-0.907 -4.75,-2.6 4.75,-2.6 4.75,-0.907 ; -4.75,0.907 -4.75,3.2 4.75,3.2 4.75,0.907 ; -3.75,-2.6 -3.75,-1.35 3.75,-1.35 3.75,-2.6 ; -3.75,-1.75 3.75,-1.75 ; -3.459,-2.6 -3.459,-1.75 ; 3.459,-2.6 3.459,-1.75
  text "1" at -4.02,1.395 h1
Mechanical 8:
  lines w0.1: -4.25,0 -3.75,0 ; -3.75,-0.5 -3.75,0 ; -3.75,0.5 -3.75,0 ; -3.25,0 -3.75,0 ; -1.75,0 -1.25,0 ; -1.25,-0.5 -1.25,0 ; -1.25,0.5 -1.25,0 ; -0.75,0 -1.25,0 ; -0.5,0 0,0 ; 0,-0.5 0,0 ; 0,0.5 0,0 ; 0.5,0 0,0 ; 0.75,0 1.25,0 ; 1.25,-0.5 1.25,0 ; 1.25,0.5 1.25,0 ; 1.75,0 1.25,0 ; 3.25,0 3.75,0 ; 3.75,-0.5 3.75,0 ; 3.75,0.5 3.75,0 ; 4.25,0 3.75,0
Mechanical 14:
  lines w0.1: -3.75,-2.6 -3.75,-1.35 3.75,-1.35 3.75,-2.6 ; -3.75,-1.75 3.75,-1.75 ; -3.459,-2.6 -3.459,-1.75 ; 3.459,-2.6 3.459,-1.75 ; -4.75,-2.6 4.75,-2.6 4.75,3.2 -4.75,3.2 -4.75,-2.6
  text "1" at -4.02,1.395 h1
3D body "MOLEX_22-04-1041.stp": height 11.7, standoff -3.4, extent -4.75,-2.6 4.75,3.2

## MOLEX_22-27-2021 [mm] "2.54mm (.100\") Pitch KK?Header, Single Row, Vertical, 2 Circuits"
height 11.7
pads (2):
  round 1.9 hole 1.2: 1(-1.27,0.002) 2(1.27,-0.002)
Top Overlay:
  lines w0.2: -1.27,-2.88 -1.27,-1.35 1.27,-1.35 1.27,-2.88 ; -1.27,-1.88 1.27,-1.88 ; -0.997,-2.88 -0.997,-1.88 ; 0.997,-2.88 0.997,-1.88 ; -2.54,-2.88 -2.54,2.92 2.54,2.92 2.54,-2.88 -2.54,-2.88
  text "1" at -1.49,1.397 h1
Mechanical 8:
  lines w0.1: -2.27,0.002 -1.27,0.002 ; -1.27,-0.998 -1.27,0.002 ; -1.27,1.002 -1.27,0.002 ; 0,-1 0,0 0,1 ; 1.27,-1.002 1.27,-0.002 ; 1.27,0.998 1.27,-0.002 ; 2.27,-0.002 1.27,-0.002
Mechanical 14:
  lines w0.1: -1.27,-2.88 -1.27,-1.35 1.27,-1.35 1.27,-2.88 ; -1.27,-1.88 1.27,-1.88 ; -0.997,-2.88 -0.997,-1.88 ; 0.997,-2.88 0.997,-1.88 ; -2.54,-2.88 -2.54,2.92 2.54,2.92 2.54,-2.88 -2.54,-2.88 ; -1.59,-0.315 -1.59,0.32 -0.95,0.32 -0.95,-0.315 -1.59,-0.315 ; 0.95,-0.32 1.59,-0.32 1.59,0.32 0.95,0.32 0.95,-0.32
  text "1" at -1.49,1.397 h1
3D body "MOLEX_22-27-2021.stp": height 11.7, standoff -3.56, extent -2.54,-2.88 2.54,2.92

## MOLEX_22-27-2031 [mm] "2.54mm (.100\") Pitch KK?Header, Single Row, Vertical, 3 Circuits"
height 11.7
pads (3):
  round 1.9 hole 1.2: 1(-2.54,0.005) 2(0,0) 3(2.54,0)
Top Overlay:
  lines w0.2: -2.54,-2.873 -2.54,-1.342 2.54,-1.342 2.54,-2.873 ; -2.54,-1.873 2.54,-1.873 ; -2.267,-2.873 -2.267,-1.873 ; 2.267,-2.873 2.267,-1.873 ; -3.81,-2.873 3.81,-2.873 3.81,2.928 -3.81,2.928 -3.81,-2.873
  text "1" at -2.75,1.4 h1
Mechanical 8:
  lines w0.1: -3.54,0.005 -2.54,0.005 ; -2.54,-0.995 -2.54,0.005 ; -2.54,1.005 -2.54,0.005 ; -1.54,0.005 -2.54,0.005 ; -1,0 0,0 ; 0,-1 0,0 ; 0,1 0,0 ; 1,0 0,0 ; 1.54,0 2.54,0 ; 2.54,-1 2.54,0 ; 2.54,1 2.54,0 ; 3.54,0 2.54,0
Mechanical 14:
  lines w0.1: -2.86,-0.312 -2.22,-0.312 -2.22,0.327 -2.86,0.327 -2.86,-0.308 ; -2.54,-2.873 -2.54,-1.342 2.54,-1.342 2.54,-2.873 ; -2.54,-1.873 2.54,-1.873 ; -2.267,-2.873 -2.267,-1.873 ; -0.32,-0.318 0.32,-0.318 0.32,0.323 -0.32,0.323 -0.32,-0.312 ; 2.22,-0.318 2.86,-0.318 2.86,0.323 2.22,0.323 2.22,-0.312 ; 2.267,-2.873 2.267,-1.873 ; -3.81,-2.873 3.81,-2.873 3.81,2.928 -3.81,2.928 -3.81,-2.873
  text "1" at -2.75,1.4 h1
3D body "MOLEX_22-27-2031.stp": height 11.7, standoff -3.56, extent -3.81,-2.873 3.81,2.927

## MOLEX_22-27-2041 [mm] "2.54mm (.100\") Pitch KK?Header, Single Row, Vertical, 4 Circuits"
height 11.7
pads (4):
  round 1.9 hole 1.2: 1(-3.81,0) 2(-1.27,0) 3(1.27,0) 4(3.81,0)
Top Overlay:
  lines w0.2: -3.81,-2.883 -3.81,-1.353 3.81,-1.353 3.81,-2.883 ; -3.81,-1.883 3.81,-1.883 ; -3.537,-2.883 -3.537,-1.883 ; 3.537,-2.883 3.537,-1.883 ; -5.08,-2.883 5.08,-2.883 5.08,2.918 -5.08,2.918 -5.08,-2.883
  text "1" at -4.02,1.395 h1
Mechanical 8:
  lines w0.1: -4.81,0 -3.81,0 ; -3.81,-1 -3.81,0 ; -3.81,1 -3.81,0 ; -2.81,0 -3.81,0 ; -2.27,0 -1.27,0 ; -1.27,-1 -1.27,0 ; -1.27,1 -1.27,0 ; 0,-1 0,0 0,1 ; 1.27,-1 1.27,0 ; 1.27,1 1.27,0 ; 2.27,0 1.27,0 ; 2.81,0 3.81,0 ; 3.81,-1 3.81,0 ; 3.81,1 3.81,0 ; 4.81,0 3.81,0
Mechanical 14:
  lines w0.1: -3.81,-2.883 -3.81,-1.353 3.81,-1.353 3.81,-2.883 ; -3.81,-1.883 3.81,-1.883 ; -3.537,-2.883 -3.537,-1.883 ; 3.537,-2.883 3.537,-1.883 ; -5.08,-2.883 5.08,-2.883 5.08,2.918 -5.08,2.918 -5.08,-2.883 ; -4.13,-0.318 -4.13,0.318 -3.49,0.318 -3.49,-0.318 -4.13,-0.318 ; -1.59,-0.318 -1.59,0.318 -0.95,0.318 -0.95,-0.318 -1.59,-0.318 ; 0.95,-0.318 0.95,0.318 1.59,0.318 1.59,-0.318 0.95,-0.318 ; 3.49,-0.318 3.49,0.318 4.13,0.318 4.13,-0.318 3.49,-0.318
  text "1" at -4.02,1.395 h1
3D body "MOLEX_22-27-2041.stp": height 11.7, standoff -3.56, extent -5.08,-2.883 5.08,2.917

## MOLEX_22-27-2051 [mm] "2.54mm (.100\") Pitch KK?Header, Single Row, Vertical, 5 Circuits"
height 11.7
pads (5):
  round 1.9 hole 1.2: 1(-5.08,0.005) 2(-2.54,0) 3(0,0) 4(2.54,0) 5(5.08,0)
Top Overlay:
  lines w0.2: -5.08,-2.88 -5.08,-1.35 5.08,-1.35 5.08,-2.88 ; -5.08,-1.88 5.08,-1.88 ; -4.807,-2.88 -4.807,-1.88 ; 4.807,-2.88 4.807,-1.88 ; -6.35,-2.88 6.35,-2.88 6.35,2.92 -6.35,2.92 -6.35,-2.88
  text "1" at -5.3,1.4 h1
Mechanical 8:
  lines w0.1: -6.08,0.005 -5.08,0.005 ; -5.08,-0.995 -5.08,0.005 ; -5.08,1.005 -5.08,0.005 ; -4.08,0.005 -5.08,0.005 ; -3.54,0 -2.54,0 ; -2.54,-1 -2.54,0 ; -2.54,1 -2.54,0 ; -1.54,0 -2.54,0 ; -1,0 0,0 ; 0,-1 0,0 ; 0,1 0,0 ; 1,0 0,0 ; 1.54,0 2.54,0 ; 2.54,-1 2.54,0 ; 2.54,1 2.54,0 ; 3.54,0 2.54,0 ; 4.08,0 5.08,0 ; 5.08,-1 5.08,0 ; 5.08,1 5.08,0 ; 6.08,0 5.08,0
Mechanical 14:
  lines w0.1: -5.08,-2.88 -5.08,-1.35 5.08,-1.35 5.08,-2.88 ; -5.08,-1.88 5.08,-1.88 ; -4.807,-2.88 -4.807,-1.88 ; 4.807,-2.88 4.807,-1.88 ; -6.35,-2.88 6.35,-2.88 6.35,2.92 -6.35,2.92 -6.35,-2.88 ; -5.4,-0.315 -5.4,0.325 -4.76,0.325 -4.76,-0.315 -5.4,-0.315 ; -2.86,-0.32 -2.22,-0.32 -2.22,0.32 -2.86,0.32 -2.86,-0.32 ; -0.32,-0.32 -0.32,0.32 0.32,0.32 0.32,-0.32 -0.32,-0.32 ; 2.22,-0.32 2.22,0.32 2.86,0.32 2.86,-0.32 2.22,-0.32 ; 4.76,-0.32 4.76,0.32 5.4,0.32 5.4,-0.32 4.76,-0.32
  text "1" at -5.3,1.4 h1
3D body "MOLEX_22-27-2051.stp": height 11.7, standoff -3.56, extent -6.35,-2.88 6.35,2.92